# Altium footprint library Components.PcbLib: 111 footprints (part 2 of 7)
Each footprint in its own frame and in the unit in brackets; x right, y up, seen from the top. Pads: shape width x height; smd on the part's side, far side on the other; paste and mask are expansions set on the pad; w line width, h text height; cw(c..) or ccw(c..) is an arc to the next point about the centre after c.
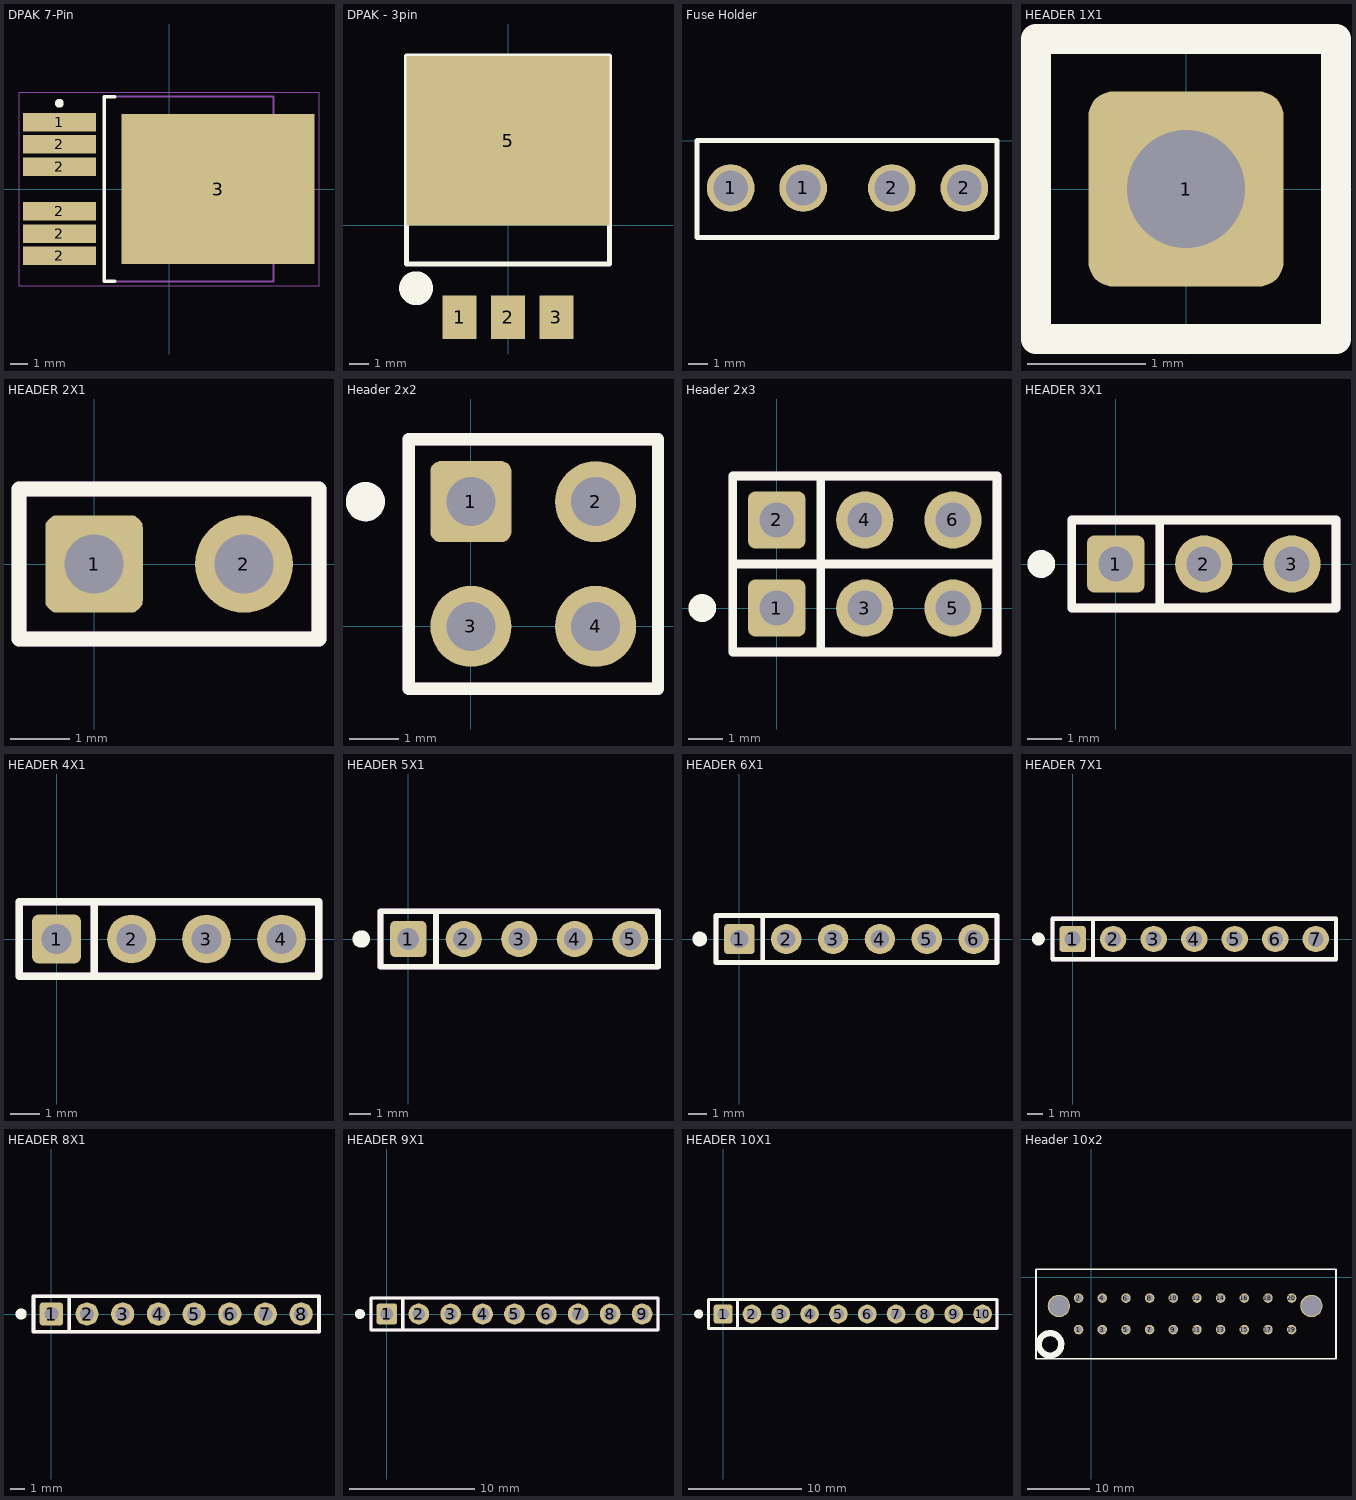
[diagram p1: the footprints below, top view; thin cyan lines are the x and y axes]

## DPAK 7-Pin [mm] "D2-PAK, 7-Pads, Body 7.93x8.63mm (max), IPC Medium Density"
height 4.83
pads (7):
  rect 4.15x1.05 smd: 1(-6.25,3.81) 2(-6.25,-3.81) 2(-6.25,-2.54) 2(-6.25,-1.27) 2(-6.25,1.27) 2(-6.25,2.54)
  rect 11x8.55 smd: 3(2.8,0)
Top Overlay:
  circle w0.25: c-6.25,4.885 r0.125
  lines w0.2: -3.1,-5.25 -3.7,-5.25 -3.7,5.25 -3.1,5.25
Mechanical 13:
  lines w0.1: -3.7,-5.275 -3.7,5.275 5.95,5.275 5.95,-5.275 -3.7,-5.275
Mechanical 15:
  lines w0.05: -8.55,-5.525 -8.55,5.525 8.55,5.525 8.55,-5.525 -8.55,-5.525
  lines w0.1: -0.5,0 0.5,0 ; 0,-0.5 0,0.5
3D body: height 4.83, standoff 0, extent -3.7,-5.275 5.95,5.275

## DPAK - 3pin [mil] "LT1085"
height 180
pads (4):
  rect 70x90 smd: 1(-100,-190) 2(0,-190) 3(100,-190)
  rect 420x350 smd: 5(0,175)
Top Overlay:
  circle w50: c-190,-130 r10
  lines w10: -210,-80 210,-80 210,350 -210,350 -210,-80
3D body: height 184, standoff 4, extent -207.5,-80 207.5,350

## Fuse Holder [mm]
height 16.25
pads (4):
  round 2.4 hole 1.75: 1(3.658,-2.388) 1(7.315,-2.388) 2(11.786,-2.388) 2(15.443,-2.388)
Top Overlay:
  lines w0.254: 1.956,-4.877 17.094,-4.877 17.094,0 1.956,0 1.956,-4.877
3D body "FuseHolder.STEP": height 8.72, standoff -2.46, extent 1.905,-4.597 16.586,0.152

## HEADER 1X1 [mil] "PinHeader 1x1 TH Pitch 2.54mm"
height 374.02
pads (1):
  rrect25% 65x65 hole 39.37: 1(0,0)
Top Overlay:
  lines w10: -50,50 50,50 ; -50,50 -50,-50 50,-50 50,50 ; -50,50 50,50
Mechanical 3:
  lines w10: -50,50 50,50 ; -50,50 -50,-50 50,-50 50,50 ; -50,50 50,50
3D body "Pin Header 1x1 TH Pitch 2.54mm.stp": height 373.85, standoff -125.98, extent -50,-50 50,50

## HEADER 2X1 [mil] "PinHeader 1x2 TH Pitch 2.54mm"
height 374.02
pads (2):
  rrect25% 65x65 hole 39.37: 1(0,0)
  round 65 hole 39.37: 2(100,0)
Top Overlay:
  lines w10: 50,50 -50,50 ; -50,50 -50,-50 150,-50 150,50 -50,50
Mechanical 3:
  lines w10: 50,50 -50,50 ; -50,50 -50,-50 150,-50 150,50 -50,50
3D body "Pin Header 1x2 TH Pitch 2.54mm.stp": height 373.85, standoff -125.98, extent -50,-50 150,50

## Header 2x2 [mil]
pads (4):
  rrect25% 65x65 hole 39.37: 1(0,100)
  round 65 hole 39.37: 2(100,100) 3(0,0) 4(100,0)
Top Overlay:
  circle w19.68: c-84.65,100 r5.91
  lines w10: 50,150 -50,150 ; -50,150 -50,50 -50,-50 150,-50 150,50 150,150 -50,150
Mechanical 3:
  lines w10: 50,150 -50,150 ; -50,150 -50,50 -50,-50 150,-50 150,50 150,150 -50,150
3D body "Pin Header 1x2 TH Pitch 2.54mm.stp": height 373.85, standoff -125.98, extent -50,50 150,150
3D body "Pin Header 1x2 TH Pitch 2.54mm.stp": height 373.85, standoff -125.98, extent -50,-50 150,50

## Header 2x3 [mil]
pads (6):
  rrect25% 65x65 hole 39.37: 1(0,0) 2(0,100)
  round 65 hole 39.37: 3(100,0) 4(100,100) 5(200,0) 6(200,100)
Top Overlay:
  circle w19.68: c-84.65,0 r5.91
  lines w10: 50,-50 50,50 ; -50,50 50,50 ; -50,50 -50,-50 250,-50 250,50 ; -50,50 250,50 ; -50,50 250,50 ; -50,50 -50,150 ; -50,150 250,150 250,50 ; -50,150 50,150 50,50
Mechanical 3:
  lines w10: 50,150 -50,150 ; -50,150 250,150 250,50 250,-50 -50,-50 -50,50 -50,150
3D body "Pin Header 1x3 TH Pitch 2.54mm.stp": height 373.85, standoff -125.98, extent -50,-50 250,50
3D body "Pin Header 1x3 TH Pitch 2.54mm.stp": height 373.85, standoff -125.98, extent -50,50 250,150

## HEADER 3X1 [mil] "PinHeader 1x3 TH Pitch 2.54mm"
height 374.02
pads (3):
  rrect25% 65x65 hole 39.37: 1(0,0)
  round 65 hole 39.37: 2(100,0) 3(200,0)
Top Overlay:
  circle w19.68: c-84.65,0 r5.91
  lines w10: 50,-50 50,50 -50,50 ; -50,50 -50,-50 250,-50 250,50 -50,50
Mechanical 3:
  lines w10: 50,-50 50,50 -50,50 ; -50,50 -50,-50 250,-50 250,50 -50,50
3D body "Pin Header 1x3 TH Pitch 2.54mm.stp": height 373.85, standoff -125.98, extent -50,-50 250,50

## HEADER 4X1 [mil] "PinHeader 1x4 TH Pitch 2.54mm"
height 374.02
pads (4):
  rrect25% 65x65 hole 39.37: 1(0,0)
  round 65 hole 39.37: 2(100,0) 3(200,0) 4(300,0)
Top Overlay:
  lines w10: 50,-50 50,50 -50,50 ; -50,50 -50,-50 350,-50 350,50 -50,50
Mechanical 3:
  lines w10: 50,-50 50,50 -50,50 ; -50,50 -50,-50 350,-50 350,50 -50,50
3D body "Pin Header 1x4 TH Pitch 2.54mm.stp": height 373.85, standoff -125.98, extent -50,-50 350,50

## HEADER 5X1 [mil] "PinHeader 1x5 TH Pitch 2.54mm"
height 374.02
pads (5):
  rrect25% 65x65 hole 39.37: 1(0,0)
  round 65 hole 39.37: 2(100,0) 3(200,0) 4(300,0) 5(400,0)
Top Overlay:
  circle w19.68: c-84.65,0 r5.91
  lines w10: 50,-50 50,50 -50,50 ; -50,50 450,50 450,-50 -50,-50 -50,50
Mechanical 3:
  lines w10: 50,-50 50,50 -50,50 ; -50,50 450,50 450,-50 -50,-50 -50,50
3D body "Pin Header 1x5 TH Pitch 2.54mm.stp": height 373.85, standoff -125.98, extent -50,-50 450,50

## HEADER 6X1 [mil] "PinHeader 1x6 TH Pitch 2.54mm"
height 374.02
pads (6):
  rrect25% 65x65 hole 39.37: 1(0,0)
  round 65 hole 39.37: 2(100,0) 3(200,0) 4(300,0) 5(400,0) 6(500,0)
Top Overlay:
  circle w19.68: c-84.65,0 r5.91
  lines w10: 50,-50 50,50 -50,50 ; -50,50 -50,-50 550,-50 550,50 -50,50
Mechanical 3:
  lines w10: 50,-50 50,50 -50,50 ; -50,50 -50,-50 550,-50 550,50 -50,50
3D body "Pin Header 1x6 TH Pitch 2.54mm.stp": height 373.85, standoff -125.98, extent -50,-50 550,50

## HEADER 7X1 [mil] "PinHeader 1x7 TH Pitch 2.54mm"
height 374.02
pads (7):
  rrect25% 65x65 hole 39.37: 1(0,0)
  round 65 hole 39.37: 2(100,0) 3(200,0) 4(300,0) 5(400,0) 6(500,0) 7(600,0)
Top Overlay:
  circle w19.68: c-84.65,0 r5.91
  lines w10: 50,-50 50,50 -50,50 ; -50,50 -50,-50 650,-50 650,50 -50,50
Mechanical 3:
  lines w10: 50,-50 50,50 -50,50 ; -50,50 -50,-50 650,-50 650,50 -50,50
3D body "Pin Header 1x7 TH Pitch 2.54mm.stp": height 373.85, standoff -125.98, extent -50,-50 650,50

## HEADER 8X1 [mil] "PinHeader 1x8 TH Pitch 2.54mm"
height 374.02
pads (8):
  rrect25% 65x65 hole 39.37: 1(0,0)
  round 65 hole 39.37: 2(100,0) 3(200,0) 4(300,0) 5(400,0) 6(500,0) 7(600,0) 8(700,0)
Top Overlay:
  circle w19.68: c-84.65,0 r5.91
  lines w10: 50,-50 50,50 -50,50 ; -50,50 750,50 750,-50 -50,-50 -50,50
Mechanical 3:
  lines w10: 50,-50 50,50 -50,50 ; -50,50 750,50 750,-50 -50,-50 -50,50
3D body "Pin Header 1x8 TH Pitch 2.54mm.stp": height 373.85, standoff -125.98, extent -50,-50 750,50

## HEADER 9X1 [mil] "PinHeader 1x9 TH Pitch 2.54mm"
height 374.02
pads (9):
  rrect25% 65x65 hole 39.37: 1(0,0)
  round 65 hole 39.37: 2(100,0) 3(200,0) 4(300,0) 5(400,0) 6(500,0) 7(600,0) 8(700,0) 9(800,0)
Top Overlay:
  circle w19.68: c-84.65,0 r5.91
  lines w10: 50,-50 50,50 -50,50 ; -50,50 -50,-50 850,-50 850,50 -50,50
Mechanical 3:
  lines w10: 50,-50 50,50 -50,50 ; -50,50 -50,-50 850,-50 850,50 -50,50
3D body "Pin Header 1x9 TH Pitch 2.54mm.stp": height 373.85, standoff -125.98, extent -50,-50 850,50

## HEADER 10X1 [mil] "PinHeader 1x10 TH Pitch 2.54mm"
height 374.02
pads (10):
  rrect25% 65x65 hole 39.37: 1(0,0)
  round 65 hole 39.37: 2(100,0) 3(200,0) 4(300,0) 5(400,0) 6(500,0) 7(600,0) 8(700,0) 9(800,0) 10(900,0)
Top Overlay:
  circle w19.68: c-84.65,0 r5.91
  lines w10: 50,-50 50,50 -50,50 ; -50,50 950,50 950,-50 -50,-50 -50,50
Mechanical 3:
  lines w10: 50,-50 50,50 -50,50 ; -50,50 950,50 950,-50 -50,-50 -50,50
3D body "Pin Header 1x10 TH Pitch 2.54mm.stp": height 373.85, standoff -125.98, extent -50,-50 950,50

## Header 10x2 [mil]
pads (22):
  round 60 hole 45.28: 1(-81,-333) 2(-81,-133) 5(219,-333) 6(219,-133) 9(519,-333) 10(519,-133) 13(819,-333) 14(819,-133) 17(1119,-333) 18(1119,-133)
  round 60 hole 40: 3(69,-333) 4(69,-133) 7(369,-333) 8(369,-133) 11(669,-333) 12(669,-133) 15(969,-333) 16(969,-133) 19(1269,-333) 20(1269,-133)
  round 141.73 hole 125.98: ""(-206,-183) ""(1394,-183)
Top Overlay:
  lines w10: 348,50 -351,50 -351,-518 1550,-518 1550,50 350,50
  lines w39.37: -191.01,-427.25 cw(c-261.87,-426) -191,-426